# Altium schematic symbol library jlcpcb_2025_04_capacitors_extended_1206.schlib: 2503 symbols (part 11 of 14)
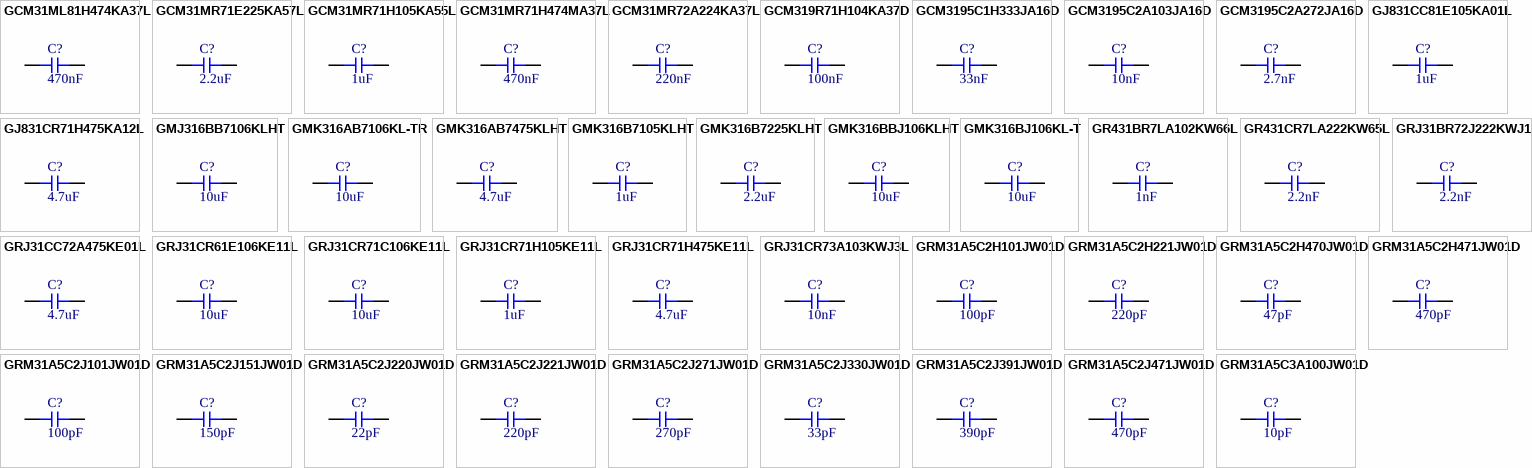
[diagram p72: symbols GCM31ML81H474KA37L to GRM31A5C3A100JW01D]

## GRM31A5C2H470JW01D
designator C?  Capacitance: 47pF  (hidden comment: *)
Capacitor, Ceramic (MLCC), 47pF, ±5%, 500V, C0G, ±5%, SMD 1206; Manufacturer: Murata Electronics; Manufacturer Part Number: GRM31A5C2H470JW01D; Package Size: 1206; JLCPCB Basic Part: No; JLCPCB Part Number: C162442; Supplier 1: LCSC; Category: Capacitors - MLCC; Supplier Part Number 1: C162442; Tolerance: ±5%; Voltage Rating: 500V; Temperature Coefficient: C0G; RoHS: Yes; ComponentLink1Description: Datasheet; ComponentLink1URL: https://wmsc.lcsc.com/wmsc/upload/file/pdf/v2/lcsc/1810201241_Murata-Electronics-GRM31A5C2H470JW01D_C162442.pdf; ComponentLink2Description: JLCPCB Part URL; ComponentLink2URL: https://jlcpcb.com/partdetail/C162442; ComponentLink3Description: LCSC Part URL; ComponentLink3URL: https://lcsc.com/product-detail/Multilayer-Ceramic-Capacitors-MLCC---SMD-SMT_Murata-Electronics-Murata-Electronics-GRM31A5C2H470JW01D_C162442.html
footprint CAP-1206 (1206 (3216M) Capacitor)
pins: 1, 2

## GRM31A5C2H471JW01D
designator C?  Capacitance: 470pF  (hidden comment: *)
Capacitor, Ceramic (MLCC), 470pF, ±5%, 500V, C0G, ±5%, SMD 1206; Manufacturer: Murata Electronics; Manufacturer Part Number: GRM31A5C2H471JW01D; Package Size: 1206; JLCPCB Basic Part: No; JLCPCB Part Number: C408150; Supplier 1: LCSC; Category: Capacitors - MLCC; Supplier Part Number 1: C408150; Tolerance: ±5%; Voltage Rating: 500V; Temperature Coefficient: C0G; RoHS: Yes; ComponentLink1Description: Datasheet; ComponentLink1URL: https://wmsc.lcsc.com/wmsc/upload/file/pdf/v2/lcsc/2304140030_Murata-Electronics-GRM31A5C2H471JW01D_C408150.pdf; ComponentLink2Description: JLCPCB Part URL; ComponentLink2URL: https://jlcpcb.com/partdetail/C408150; ComponentLink3Description: LCSC Part URL; ComponentLink3URL: https://lcsc.com/product-detail/Multilayer-Ceramic-Capacitors-MLCC---SMD-SMT_Murata-Electronics-Murata-Electronics-GRM31A5C2H471JW01D_C408150.html
footprint CAP-1206 (1206 (3216M) Capacitor)
pins: 1, 2

## GRM31A5C2J101JW01D
designator C?  Capacitance: 100pF  (hidden comment: *)
Capacitor, Ceramic (MLCC), 100pF, ±5%, 630V, C0G, ±5%, SMD 1206; Manufacturer: Murata Electronics; Manufacturer Part Number: GRM31A5C2J101JW01D; Package Size: 1206; JLCPCB Basic Part: No; JLCPCB Part Number: C162444; Supplier 1: LCSC; Category: Capacitors - MLCC; Supplier Part Number 1: C162444; Tolerance: ±5%; Voltage Rating: 630V; Temperature Coefficient: C0G; RoHS: Yes; ComponentLink1Description: Datasheet; ComponentLink1URL: https://wmsc.lcsc.com/wmsc/upload/file/pdf/v2/lcsc/1811110920_Murata-Electronics-GRM31A5C2J101JW01D_C162444.pdf; ComponentLink2Description: JLCPCB Part URL; ComponentLink2URL: https://jlcpcb.com/partdetail/C162444; ComponentLink3Description: LCSC Part URL; ComponentLink3URL: https://lcsc.com/product-detail/Multilayer-Ceramic-Capacitors-MLCC---SMD-SMT_Murata-Electronics-Murata-Electronics-GRM31A5C2J101JW01D_C162444.html
footprint CAP-1206 (1206 (3216M) Capacitor)
pins: 1, 2

## GRM31A5C2J151JW01D
designator C?  Capacitance: 150pF  (hidden comment: *)
Capacitor, Ceramic (MLCC), 150pF, ±5%, 630V, C0G, ±5%, SMD 1206; Manufacturer: Murata Electronics; Manufacturer Part Number: GRM31A5C2J151JW01D; Package Size: 1206; JLCPCB Basic Part: No; JLCPCB Part Number: C162445; Supplier 1: LCSC; Category: Capacitors - MLCC; Supplier Part Number 1: C162445; Tolerance: ±5%; Voltage Rating: 630V; Temperature Coefficient: C0G; RoHS: Yes; ComponentLink1Description: Datasheet; ComponentLink1URL: https://wmsc.lcsc.com/wmsc/upload/file/pdf/v2/lcsc/2308111643_Murata-Electronics-GRM31A5C2J151JW01D_C162445.pdf; ComponentLink2Description: JLCPCB Part URL; ComponentLink2URL: https://jlcpcb.com/partdetail/C162445; ComponentLink3Description: LCSC Part URL; ComponentLink3URL: https://lcsc.com/product-detail/Multilayer-Ceramic-Capacitors-MLCC---SMD-SMT_Murata-Electronics-Murata-Electronics-GRM31A5C2J151JW01D_C162445.html
footprint CAP-1206 (1206 (3216M) Capacitor)
pins: 1, 2

## GRM31A5C2J220JW01D
designator C?  Capacitance: 22pF  (hidden comment: *)
Capacitor, Ceramic (MLCC), 22pF, ±5%, 630V, C0G, ±5%, SMD 1206; Manufacturer: Murata Electronics; Manufacturer Part Number: GRM31A5C2J220JW01D; Package Size: 1206; JLCPCB Basic Part: No; JLCPCB Part Number: C162446; Supplier 1: LCSC; Category: Capacitors - MLCC; Supplier Part Number 1: C162446; Tolerance: ±5%; Voltage Rating: 630V; Temperature Coefficient: C0G; RoHS: Yes; ComponentLink1Description: Datasheet; ComponentLink1URL: https://wmsc.lcsc.com/wmsc/upload/file/pdf/v2/lcsc/2304140030_Murata-Electronics-GRM31A5C2J220JW01D_C162446.pdf; ComponentLink2Description: JLCPCB Part URL; ComponentLink2URL: https://jlcpcb.com/partdetail/C162446; ComponentLink3Description: LCSC Part URL; ComponentLink3URL: https://lcsc.com/product-detail/Multilayer-Ceramic-Capacitors-MLCC---SMD-SMT_Murata-Electronics-Murata-Electronics-GRM31A5C2J220JW01D_C162446.html
footprint CAP-1206 (1206 (3216M) Capacitor)
pins: 1, 2

## GRM31A5C2J221JW01D
designator C?  Capacitance: 220pF  (hidden comment: *)
Capacitor, Ceramic (MLCC), 220pF, ±5%, 630V, C0G, ±5%, SMD 1206; Manufacturer: Murata Electronics; Manufacturer Part Number: GRM31A5C2J221JW01D; Package Size: 1206; JLCPCB Basic Part: No; JLCPCB Part Number: C162447; Supplier 1: LCSC; Category: Capacitors - MLCC; Supplier Part Number 1: C162447; Tolerance: ±5%; Voltage Rating: 630V; Temperature Coefficient: C0G; RoHS: Yes; ComponentLink1Description: Datasheet; ComponentLink1URL: https://wmsc.lcsc.com/wmsc/upload/file/pdf/v2/lcsc/2304140030_Murata-Electronics-GRM31A5C2J221JW01D_C162447.pdf; ComponentLink2Description: JLCPCB Part URL; ComponentLink2URL: https://jlcpcb.com/partdetail/C162447; ComponentLink3Description: LCSC Part URL; ComponentLink3URL: https://lcsc.com/product-detail/Multilayer-Ceramic-Capacitors-MLCC---SMD-SMT_Murata-Electronics-Murata-Electronics-GRM31A5C2J221JW01D_C162447.html
footprint CAP-1206 (1206 (3216M) Capacitor)
pins: 1, 2

## GRM31A5C2J271JW01D
designator C?  Capacitance: 270pF  (hidden comment: *)
Capacitor, Ceramic (MLCC), 270pF, ±5%, 630V, C0G, ±5%, SMD 1206; Manufacturer: Murata Electronics; Manufacturer Part Number: GRM31A5C2J271JW01D; Package Size: 1206; JLCPCB Basic Part: No; JLCPCB Part Number: C711023; Supplier 1: LCSC; Category: Capacitors - MLCC; Supplier Part Number 1: C711023; Tolerance: ±5%; Voltage Rating: 630V; Temperature Coefficient: C0G; RoHS: Yes; ComponentLink1Description: Datasheet; ComponentLink1URL: https://wmsc.lcsc.com/wmsc/upload/file/pdf/v2/lcsc/2308111643_Murata-Electronics-GRM31A5C2J271JW01D_C711023.pdf; ComponentLink2Description: JLCPCB Part URL; ComponentLink2URL: https://jlcpcb.com/partdetail/C711023; ComponentLink3Description: LCSC Part URL; ComponentLink3URL: https://lcsc.com/product-detail/Multilayer-Ceramic-Capacitors-MLCC---SMD-SMT_Murata-Electronics-Murata-Electronics-GRM31A5C2J271JW01D_C711023.html
footprint CAP-1206 (1206 (3216M) Capacitor)
pins: 1, 2

## GRM31A5C2J330JW01D
designator C?  Capacitance: 33pF  (hidden comment: *)
Capacitor, Ceramic (MLCC), 33pF, ±5%, 630V, C0G, ±5%, SMD 1206; Manufacturer: Murata Electronics; Manufacturer Part Number: GRM31A5C2J330JW01D; Package Size: 1206; JLCPCB Basic Part: No; JLCPCB Part Number: C415521; Supplier 1: LCSC; Category: Capacitors - MLCC; Supplier Part Number 1: C415521; Tolerance: ±5%; Voltage Rating: 630V; Temperature Coefficient: C0G; RoHS: Yes; ComponentLink1Description: Datasheet; ComponentLink1URL: https://wmsc.lcsc.com/wmsc/upload/file/pdf/v2/lcsc/2304140030_Murata-Electronics-GRM31A5C2J330JW01D_C415521.pdf; ComponentLink2Description: JLCPCB Part URL; ComponentLink2URL: https://jlcpcb.com/partdetail/C415521; ComponentLink3Description: LCSC Part URL; ComponentLink3URL: https://lcsc.com/product-detail/Multilayer-Ceramic-Capacitors-MLCC---SMD-SMT_Murata-Electronics-Murata-Electronics-GRM31A5C2J330JW01D_C415521.html
footprint CAP-1206 (1206 (3216M) Capacitor)
pins: 1, 2

## GRM31A5C2J391JW01D
designator C?  Capacitance: 390pF  (hidden comment: *)
Capacitor, Ceramic (MLCC), 390pF, ±5%, 630V, null, ±5%, SMD 1206; Manufacturer: Murata Electronics; Manufacturer Part Number: GRM31A5C2J391JW01D; Package Size: 1206; JLCPCB Basic Part: No; JLCPCB Part Number: C2168016; Supplier 1: LCSC; Category: Capacitors - MLCC; Supplier Part Number 1: C2168016; Tolerance: ±5%; Voltage Rating: 630V; Temperature Coefficient: null; RoHS: Yes; ComponentLink1Description: Datasheet; ComponentLink1URL: https://wmsc.lcsc.com/wmsc/upload/file/pdf/v2/lcsc/2308111643_Murata-Electronics-GRM31A5C2J391JW01D_C2168016.pdf; ComponentLink2Description: JLCPCB Part URL; ComponentLink2URL: https://jlcpcb.com/partdetail/C2168016; ComponentLink3Description: LCSC Part URL; ComponentLink3URL: https://lcsc.com/product-detail/Multilayer-Ceramic-Capacitors-MLCC---SMD-SMT_Murata-Electronics-Murata-Electronics-GRM31A5C2J391JW01D_C2168016.html
footprint CAP-1206 (1206 (3216M) Capacitor)
pins: 1, 2

## GRM31A5C2J471JW01D
designator C?  Capacitance: 470pF  (hidden comment: *)
Capacitor, Ceramic (MLCC), 470pF, ±5%, 630V, C0G, ±5%, SMD 1206; Manufacturer: Murata Electronics; Manufacturer Part Number: GRM31A5C2J471JW01D; Package Size: 1206; JLCPCB Basic Part: No; JLCPCB Part Number: C162449; Supplier 1: LCSC; Category: Capacitors - MLCC; Supplier Part Number 1: C162449; Tolerance: ±5%; Voltage Rating: 630V; Temperature Coefficient: C0G; RoHS: Yes; ComponentLink1Description: Datasheet; ComponentLink1URL: https://wmsc.lcsc.com/wmsc/upload/file/pdf/v2/lcsc/2308111643_Murata-Electronics-GRM31A5C2J471JW01D_C162449.pdf; ComponentLink2Description: JLCPCB Part URL; ComponentLink2URL: https://jlcpcb.com/partdetail/C162449; ComponentLink3Description: LCSC Part URL; ComponentLink3URL: https://lcsc.com/product-detail/Multilayer-Ceramic-Capacitors-MLCC---SMD-SMT_Murata-Electronics-Murata-Electronics-GRM31A5C2J471JW01D_C162449.html
footprint CAP-1206 (1206 (3216M) Capacitor)
pins: 1, 2

## GRM31A5C3A100JW01D
designator C?  Capacitance: 10pF  (hidden comment: *)
Capacitor, Ceramic (MLCC), 10pF, ±5%, 1kV, C0G, ±5%, SMD 1206; Manufacturer: Murata Electronics; Manufacturer Part Number: GRM31A5C3A100JW01D; Package Size: 1206; JLCPCB Basic Part: No; JLCPCB Part Number: C162450; Supplier 1: LCSC; Category: Capacitors - MLCC; Supplier Part Number 1: C162450; Tolerance: ±5%; Voltage Rating: 1kV; Temperature Coefficient: C0G; RoHS: Yes; ComponentLink1Description: Datasheet; ComponentLink1URL: https://wmsc.lcsc.com/wmsc/upload/file/pdf/v2/lcsc/2304140030_Murata-Electronics-GRM31A5C3A100JW01D_C162450.pdf; ComponentLink2Description: JLCPCB Part URL; ComponentLink2URL: https://jlcpcb.com/partdetail/C162450; ComponentLink3Description: LCSC Part URL; ComponentLink3URL: https://lcsc.com/product-detail/Multilayer-Ceramic-Capacitors-MLCC---SMD-SMT_Murata-Electronics-Murata-Electronics-GRM31A5C3A100JW01D_C162450.html
footprint CAP-1206 (1206 (3216M) Capacitor)
pins: 1, 2

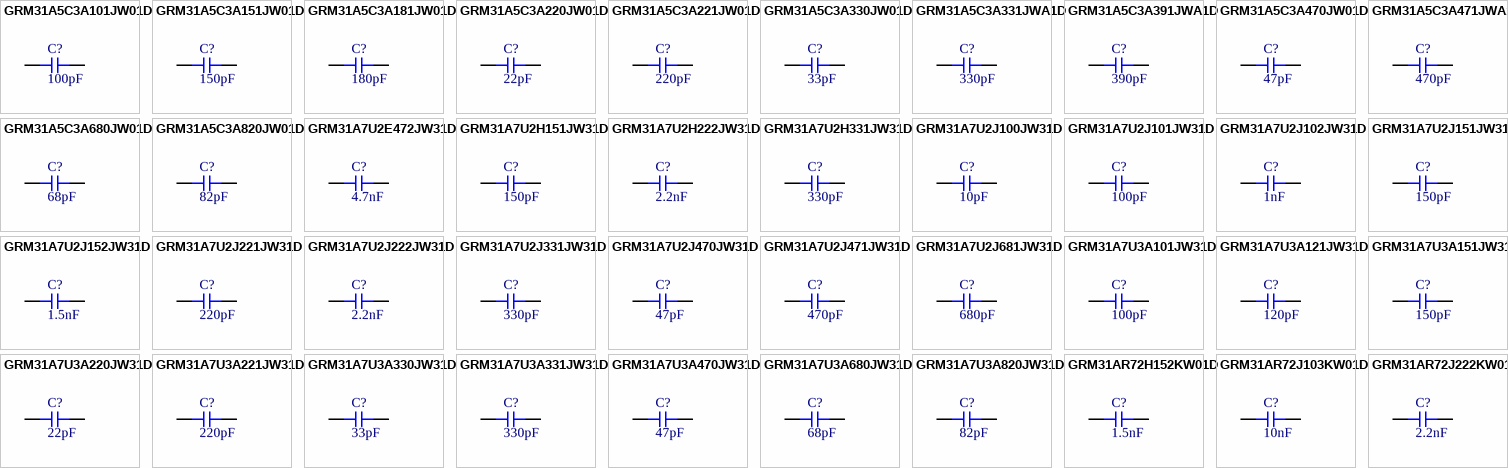
[diagram p46: symbols GRM31A5C3A101JW01D to GRM31AR72J222KW01D]

## GRM31A5C3A101JW01D
designator C?  Capacitance: 100pF  (hidden comment: *)
Capacitor, Ceramic (MLCC), 100pF, ±5%, 1kV, C0G, ±5%, SMD 1206; Manufacturer: Murata Electronics; Manufacturer Part Number: GRM31A5C3A101JW01D; Package Size: 1206; JLCPCB Basic Part: No; JLCPCB Part Number: C162451; Supplier 1: LCSC; Category: Capacitors - MLCC; Supplier Part Number 1: C162451; Tolerance: ±5%; Voltage Rating: 1kV; Temperature Coefficient: C0G; RoHS: Yes; ComponentLink1Description: Datasheet; ComponentLink1URL: https://wmsc.lcsc.com/wmsc/upload/file/pdf/v2/lcsc/1810201249_Murata-Electronics-GRM31A5C3A101JW01D_C162451.pdf; ComponentLink2Description: JLCPCB Part URL; ComponentLink2URL: https://jlcpcb.com/partdetail/C162451; ComponentLink3Description: LCSC Part URL; ComponentLink3URL: https://lcsc.com/product-detail/Multilayer-Ceramic-Capacitors-MLCC---SMD-SMT_Murata-Electronics-Murata-Electronics-GRM31A5C3A101JW01D_C162451.html
footprint CAP-1206 (1206 (3216M) Capacitor)
pins: 1, 2

## GRM31A5C3A151JW01D
designator C?  Capacitance: 150pF  (hidden comment: *)
Capacitor, Ceramic (MLCC), 150pF, ±5%, 1kV, C0G, ±5%, SMD 1206; Manufacturer: Murata Electronics; Manufacturer Part Number: GRM31A5C3A151JW01D; Package Size: 1206; JLCPCB Basic Part: No; JLCPCB Part Number: C162452; Supplier 1: LCSC; Category: Capacitors - MLCC; Supplier Part Number 1: C162452; Tolerance: ±5%; Voltage Rating: 1kV; Temperature Coefficient: C0G; RoHS: Yes; ComponentLink1Description: Datasheet; ComponentLink1URL: https://wmsc.lcsc.com/wmsc/upload/file/pdf/v2/lcsc/2308111643_Murata-Electronics-GRM31A5C3A151JW01D_C162452.pdf; ComponentLink2Description: JLCPCB Part URL; ComponentLink2URL: https://jlcpcb.com/partdetail/C162452; ComponentLink3Description: LCSC Part URL; ComponentLink3URL: https://lcsc.com/product-detail/Multilayer-Ceramic-Capacitors-MLCC---SMD-SMT_Murata-Electronics-Murata-Electronics-GRM31A5C3A151JW01D_C162452.html
footprint CAP-1206 (1206 (3216M) Capacitor)
pins: 1, 2

## GRM31A5C3A181JW01D
designator C?  Capacitance: 180pF  (hidden comment: *)
Capacitor, Ceramic (MLCC), 180pF, ±5%, 1kV, C0G, ±5%, SMD 1206; Manufacturer: Murata Electronics; Manufacturer Part Number: GRM31A5C3A181JW01D; Package Size: 1206; JLCPCB Basic Part: No; JLCPCB Part Number: C3832761; Supplier 1: LCSC; Category: Capacitors - MLCC; Supplier Part Number 1: C3832761; Tolerance: ±5%; Voltage Rating: 1kV; Temperature Coefficient: C0G; RoHS: Yes; ComponentLink1Description: Datasheet; ComponentLink1URL: https://wmsc.lcsc.com/wmsc/upload/file/pdf/v2/lcsc/2308111741_Murata-Electronics-GRM31A5C3A181JW01D_C3832761.pdf; ComponentLink2Description: JLCPCB Part URL; ComponentLink2URL: https://jlcpcb.com/partdetail/C3832761; ComponentLink3Description: LCSC Part URL; ComponentLink3URL: https://lcsc.com/product-detail/Multilayer-Ceramic-Capacitors-MLCC---SMD-SMT_Murata-Electronics-Murata-Electronics-GRM31A5C3A181JW01D_C3832761.html
footprint CAP-1206 (1206 (3216M) Capacitor)
pins: 1, 2

## GRM31A5C3A220JW01D
designator C?  Capacitance: 22pF  (hidden comment: *)
Capacitor, Ceramic (MLCC), 22pF, ±5%, 1kV, C0G, ±5%, SMD 1206; Manufacturer: Murata Electronics; Manufacturer Part Number: GRM31A5C3A220JW01D; Package Size: 1206; JLCPCB Basic Part: No; JLCPCB Part Number: C701198; Supplier 1: LCSC; Category: Capacitors - MLCC; Supplier Part Number 1: C701198; Tolerance: ±5%; Voltage Rating: 1kV; Temperature Coefficient: C0G; RoHS: Yes; ComponentLink1Description: Datasheet; ComponentLink1URL: https://wmsc.lcsc.com/wmsc/upload/file/pdf/v2/lcsc/2007151336_Murata-Electronics-GRM31A5C3A220JW01D_C701198.pdf; ComponentLink2Description: JLCPCB Part URL; ComponentLink2URL: https://jlcpcb.com/partdetail/C701198; ComponentLink3Description: LCSC Part URL; ComponentLink3URL: https://lcsc.com/product-detail/Multilayer-Ceramic-Capacitors-MLCC---SMD-SMT_Murata-Electronics-Murata-Electronics-GRM31A5C3A220JW01D_C701198.html
footprint CAP-1206 (1206 (3216M) Capacitor)
pins: 1, 2

## GRM31A5C3A221JW01D
designator C?  Capacitance: 220pF  (hidden comment: *)
Capacitor, Ceramic (MLCC), 220pF, ±5%, 1kV, C0G, ±5%, SMD 1206; Manufacturer: Murata Electronics; Manufacturer Part Number: GRM31A5C3A221JW01D; Package Size: 1206; JLCPCB Basic Part: No; JLCPCB Part Number: C361064; Supplier 1: LCSC; Category: Capacitors - MLCC; Supplier Part Number 1: C361064; Tolerance: ±5%; Voltage Rating: 1kV; Temperature Coefficient: C0G; RoHS: Yes; ComponentLink1Description: Datasheet; ComponentLink1URL: https://wmsc.lcsc.com/wmsc/upload/file/pdf/v2/lcsc/1912111437_Murata-Electronics-GRM31A5C3A221JW01D_C361064.pdf; ComponentLink2Description: JLCPCB Part URL; ComponentLink2URL: https://jlcpcb.com/partdetail/C361064; ComponentLink3Description: LCSC Part URL; ComponentLink3URL: https://lcsc.com/product-detail/Multilayer-Ceramic-Capacitors-MLCC---SMD-SMT_Murata-Electronics-Murata-Electronics-GRM31A5C3A221JW01D_C361064.html
footprint CAP-1206 (1206 (3216M) Capacitor)
pins: 1, 2

## GRM31A5C3A330JW01D
designator C?  Capacitance: 33pF  (hidden comment: *)
Capacitor, Ceramic (MLCC), 33pF, ±5%, 1kV, C0G, ±5%, SMD 1206; Manufacturer: Murata Electronics; Manufacturer Part Number: GRM31A5C3A330JW01D; Package Size: 1206; JLCPCB Basic Part: No; JLCPCB Part Number: C162453; Supplier 1: LCSC; Category: Capacitors - MLCC; Supplier Part Number 1: C162453; Tolerance: ±5%; Voltage Rating: 1kV; Temperature Coefficient: C0G; RoHS: Yes; ComponentLink1Description: Datasheet; ComponentLink1URL: https://wmsc.lcsc.com/wmsc/upload/file/pdf/v2/lcsc/1810201241_Murata-Electronics-GRM31A5C3A330JW01D_C162453.pdf; ComponentLink2Description: JLCPCB Part URL; ComponentLink2URL: https://jlcpcb.com/partdetail/C162453; ComponentLink3Description: LCSC Part URL; ComponentLink3URL: https://lcsc.com/product-detail/Multilayer-Ceramic-Capacitors-MLCC---SMD-SMT_Murata-Electronics-Murata-Electronics-GRM31A5C3A330JW01D_C162453.html
footprint CAP-1206 (1206 (3216M) Capacitor)
pins: 1, 2

## GRM31A5C3A331JWA1D
designator C?  Capacitance: 330pF  (hidden comment: *)
Capacitor, Ceramic (MLCC), 330pF, ±5%, 1kV, ±5%, SMD 1206; Manufacturer: Murata Electronics; Manufacturer Part Number: GRM31A5C3A331JWA1D; Package Size: 1206; JLCPCB Basic Part: No; JLCPCB Part Number: C701166; Supplier 1: LCSC; Category: Capacitors - MLCC; Supplier Part Number 1: C701166; Tolerance: ±5%; Voltage Rating: 1kV; RoHS: Yes; ComponentLink1Description: Datasheet; ComponentLink1URL: https://wmsc.lcsc.com/wmsc/upload/file/pdf/v2/lcsc/2201131100_Murata-Electronics-GRM31A5C3A331JWA1D_C701166.pdf; ComponentLink2Description: JLCPCB Part URL; ComponentLink2URL: https://jlcpcb.com/partdetail/C701166; ComponentLink3Description: LCSC Part URL; ComponentLink3URL: https://lcsc.com/product-detail/Multilayer-Ceramic-Capacitors-MLCC---SMD-SMT_Murata-Electronics-Murata-Electronics-GRM31A5C3A331JWA1D_C701166.html
footprint CAP-1206 (1206 (3216M) Capacitor)
pins: 1, 2

## GRM31A5C3A391JWA1D
designator C?  Capacitance: 390pF  (hidden comment: *)
Capacitor, Ceramic (MLCC), 390pF, ±5%, ±5%, SMD 1206; Manufacturer: Murata Electronics; Manufacturer Part Number: GRM31A5C3A391JWA1D; Package Size: 1206; JLCPCB Basic Part: No; JLCPCB Part Number: C907751; Supplier 1: LCSC; Category: Capacitors - MLCC; Supplier Part Number 1: C907751; Tolerance: ±5%; RoHS: Yes; ComponentLink1Description: Datasheet; ComponentLink1URL: https://wmsc.lcsc.com/wmsc/upload/file/pdf/v2/lcsc/2011151633_Murata-Electronics-GRM31A5C3A391JWA1D_C907751.pdf; ComponentLink2Description: JLCPCB Part URL; ComponentLink2URL: https://jlcpcb.com/partdetail/C907751; ComponentLink3Description: LCSC Part URL; ComponentLink3URL: https://lcsc.com/product-detail/Multilayer-Ceramic-Capacitors-MLCC---SMD-SMT_Murata-Electronics-Murata-Electronics-GRM31A5C3A391JWA1D_C907751.html
footprint CAP-1206 (1206 (3216M) Capacitor)
pins: 1, 2

## GRM31A5C3A470JW01D
designator C?  Capacitance: 47pF  (hidden comment: *)
Capacitor, Ceramic (MLCC), 47pF, ±5%, 1kV, C0G, ±5%, SMD 1206; Manufacturer: Murata Electronics; Manufacturer Part Number: GRM31A5C3A470JW01D; Package Size: 1206; JLCPCB Basic Part: No; JLCPCB Part Number: C162454; Supplier 1: LCSC; Category: Capacitors - MLCC; Supplier Part Number 1: C162454; Tolerance: ±5%; Voltage Rating: 1kV; Temperature Coefficient: C0G; RoHS: Yes; ComponentLink1Description: Datasheet; ComponentLink1URL: https://wmsc.lcsc.com/wmsc/upload/file/pdf/v2/lcsc/2308111643_Murata-Electronics-GRM31A5C3A470JW01D_C162454.pdf; ComponentLink2Description: JLCPCB Part URL; ComponentLink2URL: https://jlcpcb.com/partdetail/C162454; ComponentLink3Description: LCSC Part URL; ComponentLink3URL: https://lcsc.com/product-detail/Multilayer-Ceramic-Capacitors-MLCC---SMD-SMT_Murata-Electronics-Murata-Electronics-GRM31A5C3A470JW01D_C162454.html
footprint CAP-1206 (1206 (3216M) Capacitor)
pins: 1, 2

## GRM31A5C3A471JWA1D
designator C?  Capacitance: 470pF  (hidden comment: *)
Capacitor, Ceramic (MLCC), 470pF, ±5%, 1kV, null, ±5%, SMD 1206; Manufacturer: Murata Electronics; Manufacturer Part Number: GRM31A5C3A471JWA1D; Package Size: 1206; JLCPCB Basic Part: No; JLCPCB Part Number: C701190; Supplier 1: LCSC; Category: Capacitors - MLCC; Supplier Part Number 1: C701190; Tolerance: ±5%; Voltage Rating: 1kV; Temperature Coefficient: null; RoHS: Yes; ComponentLink1Description: Datasheet; ComponentLink1URL: https://wmsc.lcsc.com/wmsc/upload/file/pdf/v2/lcsc/2201131100_Murata-Electronics-GRM31A5C3A471JWA1D_C701190.pdf; ComponentLink2Description: JLCPCB Part URL; ComponentLink2URL: https://jlcpcb.com/partdetail/C701190; ComponentLink3Description: LCSC Part URL; ComponentLink3URL: https://lcsc.com/product-detail/Multilayer-Ceramic-Capacitors-MLCC---SMD-SMT_Murata-Electronics-Murata-Electronics-GRM31A5C3A471JWA1D_C701190.html
footprint CAP-1206 (1206 (3216M) Capacitor)
pins: 1, 2

## GRM31A5C3A680JW01D
designator C?  Capacitance: 68pF  (hidden comment: *)
Capacitor, Ceramic (MLCC), 68pF, ±5%, 1kV, null, ±5%, SMD 1206; Manufacturer: Murata Electronics; Manufacturer Part Number: GRM31A5C3A680JW01D; Package Size: 1206; JLCPCB Basic Part: No; JLCPCB Part Number: C440203; Supplier 1: LCSC; Category: Capacitors - MLCC; Supplier Part Number 1: C440203; Tolerance: ±5%; Voltage Rating: 1kV; Temperature Coefficient: null; RoHS: Yes; ComponentLink1Description: Datasheet; ComponentLink1URL: https://wmsc.lcsc.com/wmsc/upload/file/pdf/v2/lcsc/2308111643_Murata-Electronics-GRM31A5C3A680JW01D_C440203.pdf; ComponentLink2Description: JLCPCB Part URL; ComponentLink2URL: https://jlcpcb.com/partdetail/C440203; ComponentLink3Description: LCSC Part URL; ComponentLink3URL: https://lcsc.com/product-detail/Multilayer-Ceramic-Capacitors-MLCC---SMD-SMT_Murata-Electronics-Murata-Electronics-GRM31A5C3A680JW01D_C440203.html
footprint CAP-1206 (1206 (3216M) Capacitor)
pins: 1, 2

## GRM31A5C3A820JW01D
designator C?  Capacitance: 82pF  (hidden comment: *)
Capacitor, Ceramic (MLCC), 82pF, ±5%, 1kV, null, ±5%, SMD 1206; Manufacturer: Murata Electronics; Manufacturer Part Number: GRM31A5C3A820JW01D; Package Size: 1206; JLCPCB Basic Part: No; JLCPCB Part Number: C2170892; Supplier 1: LCSC; Category: Capacitors - MLCC; Supplier Part Number 1: C2170892; Tolerance: ±5%; Voltage Rating: 1kV; Temperature Coefficient: null; RoHS: Yes; ComponentLink1Description: Datasheet; ComponentLink1URL: https://wmsc.lcsc.com/wmsc/upload/file/pdf/v2/lcsc/2308111643_Murata-Electronics-GRM31A5C3A820JW01D_C2170892.pdf; ComponentLink2Description: JLCPCB Part URL; ComponentLink2URL: https://jlcpcb.com/partdetail/C2170892; ComponentLink3Description: LCSC Part URL; ComponentLink3URL: https://lcsc.com/product-detail/Multilayer-Ceramic-Capacitors-MLCC---SMD-SMT_Murata-Electronics-Murata-Electronics-GRM31A5C3A820JW01D_C2170892.html
footprint CAP-1206 (1206 (3216M) Capacitor)
pins: 1, 2

## GRM31A7U2E472JW31D
designator C?  Capacitance: 4.7nF  (hidden comment: *)
Capacitor, Ceramic (MLCC), 4.7nF, ±5%, 250V, U2J, ±5%, SMD 1206; Manufacturer: Murata Electronics; Manufacturer Part Number: GRM31A7U2E472JW31D; Package Size: 1206; JLCPCB Basic Part: No; JLCPCB Part Number: C692632; Supplier 1: LCSC; Category: Capacitors - MLCC; Supplier Part Number 1: C692632; Tolerance: ±5%; Voltage Rating: 250V; Temperature Coefficient: U2J; RoHS: Yes; ComponentLink1Description: Datasheet; ComponentLink1URL: https://wmsc.lcsc.com/wmsc/upload/file/pdf/v2/lcsc/2308111642_Murata-Electronics-GRM31A7U2E472JW31D_C692632.pdf; ComponentLink2Description: JLCPCB Part URL; ComponentLink2URL: https://jlcpcb.com/partdetail/C692632; ComponentLink3Description: LCSC Part URL; ComponentLink3URL: https://lcsc.com/product-detail/Multilayer-Ceramic-Capacitors-MLCC---SMD-SMT_Murata-Electronics-Murata-Electronics-GRM31A7U2E472JW31D_C692632.html
footprint CAP-1206 (1206 (3216M) Capacitor)
pins: 1, 2

## GRM31A7U2H151JW31D
designator C?  Capacitance: 150pF  (hidden comment: *)
Capacitor, Ceramic (MLCC), 150pF, ±5%, 500V, U2J, ±5%, SMD 1206; Manufacturer: Murata Electronics; Manufacturer Part Number: GRM31A7U2H151JW31D; Package Size: 1206; JLCPCB Basic Part: No; JLCPCB Part Number: C162455; Supplier 1: LCSC; Category: Capacitors - MLCC; Supplier Part Number 1: C162455; Tolerance: ±5%; Voltage Rating: 500V; Temperature Coefficient: U2J; RoHS: Yes; ComponentLink1Description: Datasheet; ComponentLink1URL: https://wmsc.lcsc.com/wmsc/upload/file/pdf/v2/lcsc/2304140030_Murata-Electronics-GRM31A7U2H151JW31D_C162455.pdf; ComponentLink2Description: JLCPCB Part URL; ComponentLink2URL: https://jlcpcb.com/partdetail/C162455; ComponentLink3Description: LCSC Part URL; ComponentLink3URL: https://lcsc.com/product-detail/Multilayer-Ceramic-Capacitors-MLCC---SMD-SMT_Murata-Electronics-Murata-Electronics-GRM31A7U2H151JW31D_C162455.html
footprint CAP-1206 (1206 (3216M) Capacitor)
pins: 1, 2

## GRM31A7U2H222JW31D
designator C?  Capacitance: 2.2nF  (hidden comment: *)
Capacitor, Ceramic (MLCC), 2.2nF, ±5%, 500V, U2J, ±5%, SMD 1206; Manufacturer: Murata Electronics; Manufacturer Part Number: GRM31A7U2H222JW31D; Package Size: 1206; JLCPCB Basic Part: No; JLCPCB Part Number: C162456; Supplier 1: LCSC; Category: Capacitors - MLCC; Supplier Part Number 1: C162456; Tolerance: ±5%; Voltage Rating: 500V; Temperature Coefficient: U2J; RoHS: Yes; ComponentLink1Description: Datasheet; ComponentLink1URL: https://wmsc.lcsc.com/wmsc/upload/file/pdf/v2/lcsc/2308111642_Murata-Electronics-GRM31A7U2H222JW31D_C162456.pdf; ComponentLink2Description: JLCPCB Part URL; ComponentLink2URL: https://jlcpcb.com/partdetail/C162456; ComponentLink3Description: LCSC Part URL; ComponentLink3URL: https://lcsc.com/product-detail/Multilayer-Ceramic-Capacitors-MLCC---SMD-SMT_Murata-Electronics-Murata-Electronics-GRM31A7U2H222JW31D_C162456.html
footprint CAP-1206 (1206 (3216M) Capacitor)
pins: 1, 2

## GRM31A7U2H331JW31D
designator C?  Capacitance: 330pF  (hidden comment: *)
Capacitor, Ceramic (MLCC), 330pF, ±5%, 500V, U2J, ±5%, SMD 1206; Manufacturer: Murata Electronics; Manufacturer Part Number: GRM31A7U2H331JW31D; Package Size: 1206; JLCPCB Basic Part: No; JLCPCB Part Number: C162457; Supplier 1: LCSC; Category: Capacitors - MLCC; Supplier Part Number 1: C162457; Tolerance: ±5%; Voltage Rating: 500V; Temperature Coefficient: U2J; RoHS: Yes; ComponentLink1Description: Datasheet; ComponentLink1URL: https://wmsc.lcsc.com/wmsc/upload/file/pdf/v2/lcsc/2304140030_Murata-Electronics-GRM31A7U2H331JW31D_C162457.pdf; ComponentLink2Description: JLCPCB Part URL; ComponentLink2URL: https://jlcpcb.com/partdetail/C162457; ComponentLink3Description: LCSC Part URL; ComponentLink3URL: https://lcsc.com/product-detail/Multilayer-Ceramic-Capacitors-MLCC---SMD-SMT_Murata-Electronics-Murata-Electronics-GRM31A7U2H331JW31D_C162457.html
footprint CAP-1206 (1206 (3216M) Capacitor)
pins: 1, 2

## GRM31A7U2J100JW31D
designator C?  Capacitance: 10pF  (hidden comment: *)
Capacitor, Ceramic (MLCC), 10pF, ±5%, 630V, U2J, ±5%, SMD 1206; Manufacturer: Murata Electronics; Manufacturer Part Number: GRM31A7U2J100JW31D; Package Size: 1206; JLCPCB Basic Part: No; JLCPCB Part Number: C703130; Supplier 1: LCSC; Category: Capacitors - MLCC; Supplier Part Number 1: C703130; Tolerance: ±5%; Voltage Rating: 630V; Temperature Coefficient: U2J; RoHS: Yes; ComponentLink1Description: Datasheet; ComponentLink1URL: https://wmsc.lcsc.com/wmsc/upload/file/pdf/v2/lcsc/2304140030_Murata-Electronics-GRM31A7U2J100JW31D_C703130.pdf; ComponentLink2Description: JLCPCB Part URL; ComponentLink2URL: https://jlcpcb.com/partdetail/C703130; ComponentLink3Description: LCSC Part URL; ComponentLink3URL: https://lcsc.com/product-detail/Multilayer-Ceramic-Capacitors-MLCC---SMD-SMT_Murata-Electronics-Murata-Electronics-GRM31A7U2J100JW31D_C703130.html
footprint CAP-1206 (1206 (3216M) Capacitor)
pins: 1, 2

## GRM31A7U2J101JW31D
designator C?  Capacitance: 100pF  (hidden comment: *)
Capacitor, Ceramic (MLCC), 100pF, ±5%, 630V, U2J, ±5%, SMD 1206; Manufacturer: Murata Electronics; Manufacturer Part Number: GRM31A7U2J101JW31D; Package Size: 1206; JLCPCB Basic Part: No; JLCPCB Part Number: C97933; Supplier 1: LCSC; Category: Capacitors - MLCC; Supplier Part Number 1: C97933; Tolerance: ±5%; Voltage Rating: 630V; Temperature Coefficient: U2J; RoHS: Yes; ComponentLink1Description: Datasheet; ComponentLink1URL: https://wmsc.lcsc.com/wmsc/upload/file/pdf/v2/lcsc/1810201312_Murata-Electronics-GRM31A7U2J101JW31D_C97933.pdf; ComponentLink2Description: JLCPCB Part URL; ComponentLink2URL: https://jlcpcb.com/partdetail/C97933; ComponentLink3Description: LCSC Part URL; ComponentLink3URL: https://lcsc.com/product-detail/Multilayer-Ceramic-Capacitors-MLCC---SMD-SMT_Murata-Electronics-Murata-Electronics-GRM31A7U2J101JW31D_C97933.html
footprint CAP-1206 (1206 (3216M) Capacitor)
pins: 1, 2

## GRM31A7U2J102JW31D
designator C?  Capacitance: 1nF  (hidden comment: *)
Capacitor, Ceramic (MLCC), 1nF, ±5%, 630V, U2J, ±5%, SMD 1206; Manufacturer: Murata Electronics; Manufacturer Part Number: GRM31A7U2J102JW31D; Package Size: 1206; JLCPCB Basic Part: No; JLCPCB Part Number: C97934; Supplier 1: LCSC; Category: Capacitors - MLCC; Supplier Part Number 1: C97934; Tolerance: ±5%; Voltage Rating: 630V; Temperature Coefficient: U2J; RoHS: Yes; ComponentLink1Description: Datasheet; ComponentLink1URL: https://wmsc.lcsc.com/wmsc/upload/file/pdf/v2/lcsc/1810201314_Murata-Electronics-GRM31A7U2J102JW31D_C97934.pdf; ComponentLink2Description: JLCPCB Part URL; ComponentLink2URL: https://jlcpcb.com/partdetail/C97934; ComponentLink3Description: LCSC Part URL; ComponentLink3URL: https://lcsc.com/product-detail/Multilayer-Ceramic-Capacitors-MLCC---SMD-SMT_Murata-Electronics-Murata-Electronics-GRM31A7U2J102JW31D_C97934.html
footprint CAP-1206 (1206 (3216M) Capacitor)
pins: 1, 2

## GRM31A7U2J151JW31D
designator C?  Capacitance: 150pF  (hidden comment: *)
Capacitor, Ceramic (MLCC), 150pF, ±5%, 630V, U2J, ±5%, SMD 1206; Manufacturer: Murata Electronics; Manufacturer Part Number: GRM31A7U2J151JW31D; Package Size: 1206; JLCPCB Basic Part: No; JLCPCB Part Number: C162458; Supplier 1: LCSC; Category: Capacitors - MLCC; Supplier Part Number 1: C162458; Tolerance: ±5%; Voltage Rating: 630V; Temperature Coefficient: U2J; RoHS: Yes; ComponentLink1Description: Datasheet; ComponentLink1URL: https://wmsc.lcsc.com/wmsc/upload/file/pdf/v2/lcsc/2304140030_Murata-Electronics-GRM31A7U2J151JW31D_C162458.pdf; ComponentLink2Description: JLCPCB Part URL; ComponentLink2URL: https://jlcpcb.com/partdetail/C162458; ComponentLink3Description: LCSC Part URL; ComponentLink3URL: https://lcsc.com/product-detail/Multilayer-Ceramic-Capacitors-MLCC---SMD-SMT_Murata-Electronics-Murata-Electronics-GRM31A7U2J151JW31D_C162458.html
footprint CAP-1206 (1206 (3216M) Capacitor)
pins: 1, 2

## GRM31A7U2J152JW31D
designator C?  Capacitance: 1.5nF  (hidden comment: *)
Capacitor, Ceramic (MLCC), 1.5nF, ±5%, 630V, U2J, ±5%, SMD 1206; Manufacturer: Murata Electronics; Manufacturer Part Number: GRM31A7U2J152JW31D; Package Size: 1206; JLCPCB Basic Part: No; JLCPCB Part Number: C162459; Supplier 1: LCSC; Category: Capacitors - MLCC; Supplier Part Number 1: C162459; Tolerance: ±5%; Voltage Rating: 630V; Temperature Coefficient: U2J; RoHS: Yes; ComponentLink1Description: Datasheet; ComponentLink1URL: https://wmsc.lcsc.com/wmsc/upload/file/pdf/v2/lcsc/2304140030_Murata-Electronics-GRM31A7U2J152JW31D_C162459.pdf; ComponentLink2Description: JLCPCB Part URL; ComponentLink2URL: https://jlcpcb.com/partdetail/C162459; ComponentLink3Description: LCSC Part URL; ComponentLink3URL: https://lcsc.com/product-detail/Multilayer-Ceramic-Capacitors-MLCC---SMD-SMT_Murata-Electronics-Murata-Electronics-GRM31A7U2J152JW31D_C162459.html
footprint CAP-1206 (1206 (3216M) Capacitor)
pins: 1, 2

## GRM31A7U2J221JW31D
designator C?  Capacitance: 220pF  (hidden comment: *)
Capacitor, Ceramic (MLCC), 220pF, ±5%, 630V, U2J, ±5%, SMD 1206; Manufacturer: Murata Electronics; Manufacturer Part Number: GRM31A7U2J221JW31D; Package Size: 1206; JLCPCB Basic Part: No; JLCPCB Part Number: C162460; Supplier 1: LCSC; Category: Capacitors - MLCC; Supplier Part Number 1: C162460; Tolerance: ±5%; Voltage Rating: 630V; Temperature Coefficient: U2J; RoHS: Yes; ComponentLink1Description: Datasheet; ComponentLink1URL: https://wmsc.lcsc.com/wmsc/upload/file/pdf/v2/lcsc/2304140030_Murata-Electronics-GRM31A7U2J221JW31D_C162460.pdf; ComponentLink2Description: JLCPCB Part URL; ComponentLink2URL: https://jlcpcb.com/partdetail/C162460; ComponentLink3Description: LCSC Part URL; ComponentLink3URL: https://lcsc.com/product-detail/Multilayer-Ceramic-Capacitors-MLCC---SMD-SMT_Murata-Electronics-Murata-Electronics-GRM31A7U2J221JW31D_C162460.html
footprint CAP-1206 (1206 (3216M) Capacitor)
pins: 1, 2

## GRM31A7U2J222JW31D
designator C?  Capacitance: 2.2nF  (hidden comment: *)
Capacitor, Ceramic (MLCC), 2.2nF, ±5%, 630V, U2J, ±5%, SMD 1206; Manufacturer: Murata Electronics; Manufacturer Part Number: GRM31A7U2J222JW31D; Package Size: 1206; JLCPCB Basic Part: No; JLCPCB Part Number: C162461; Supplier 1: LCSC; Category: Capacitors - MLCC; Supplier Part Number 1: C162461; Tolerance: ±5%; Voltage Rating: 630V; Temperature Coefficient: U2J; RoHS: Yes; ComponentLink1Description: Datasheet; ComponentLink1URL: https://wmsc.lcsc.com/wmsc/upload/file/pdf/v2/lcsc/2304140030_Murata-Electronics-GRM31A7U2J222JW31D_C162461.pdf; ComponentLink2Description: JLCPCB Part URL; ComponentLink2URL: https://jlcpcb.com/partdetail/C162461; ComponentLink3Description: LCSC Part URL; ComponentLink3URL: https://lcsc.com/product-detail/Multilayer-Ceramic-Capacitors-MLCC---SMD-SMT_Murata-Electronics-Murata-Electronics-GRM31A7U2J222JW31D_C162461.html
footprint CAP-1206 (1206 (3216M) Capacitor)
pins: 1, 2

## GRM31A7U2J331JW31D
designator C?  Capacitance: 330pF  (hidden comment: *)
Capacitor, Ceramic (MLCC), 330pF, ±5%, 630V, U2J, ±5%, SMD 1206; Manufacturer: Murata Electronics; Manufacturer Part Number: GRM31A7U2J331JW31D; Package Size: 1206; JLCPCB Basic Part: No; JLCPCB Part Number: C162462; Supplier 1: LCSC; Category: Capacitors - MLCC; Supplier Part Number 1: C162462; Tolerance: ±5%; Voltage Rating: 630V; Temperature Coefficient: U2J; RoHS: Yes; ComponentLink1Description: Datasheet; ComponentLink1URL: https://wmsc.lcsc.com/wmsc/upload/file/pdf/v2/lcsc/1810201241_Murata-Electronics-GRM31A7U2J331JW31D_C162462.pdf; ComponentLink2Description: JLCPCB Part URL; ComponentLink2URL: https://jlcpcb.com/partdetail/C162462; ComponentLink3Description: LCSC Part URL; ComponentLink3URL: https://lcsc.com/product-detail/Multilayer-Ceramic-Capacitors-MLCC---SMD-SMT_Murata-Electronics-Murata-Electronics-GRM31A7U2J331JW31D_C162462.html
footprint CAP-1206 (1206 (3216M) Capacitor)
pins: 1, 2

## GRM31A7U2J470JW31D
designator C?  Capacitance: 47pF  (hidden comment: *)
Capacitor, Ceramic (MLCC), 47pF, ±5%, 630V, U2J, ±5%, SMD 1206; Manufacturer: Murata Electronics; Manufacturer Part Number: GRM31A7U2J470JW31D; Package Size: 1206; JLCPCB Basic Part: No; JLCPCB Part Number: C162463; Supplier 1: LCSC; Category: Capacitors - MLCC; Supplier Part Number 1: C162463; Tolerance: ±5%; Voltage Rating: 630V; Temperature Coefficient: U2J; RoHS: Yes; ComponentLink1Description: Datasheet; ComponentLink1URL: https://wmsc.lcsc.com/wmsc/upload/file/pdf/v2/lcsc/1810201251_Murata-Electronics-GRM31A7U2J470JW31D_C162463.pdf; ComponentLink2Description: JLCPCB Part URL; ComponentLink2URL: https://jlcpcb.com/partdetail/C162463; ComponentLink3Description: LCSC Part URL; ComponentLink3URL: https://lcsc.com/product-detail/Multilayer-Ceramic-Capacitors-MLCC---SMD-SMT_Murata-Electronics-Murata-Electronics-GRM31A7U2J470JW31D_C162463.html
footprint CAP-1206 (1206 (3216M) Capacitor)
pins: 1, 2

## GRM31A7U2J471JW31D
designator C?  Capacitance: 470pF  (hidden comment: *)
Capacitor, Ceramic (MLCC), 470pF, ±5%, 630V, U2J, ±5%, SMD 1206; Manufacturer: Murata Electronics; Manufacturer Part Number: GRM31A7U2J471JW31D; Package Size: 1206; JLCPCB Basic Part: No; JLCPCB Part Number: C162464; Supplier 1: LCSC; Category: Capacitors - MLCC; Supplier Part Number 1: C162464; Tolerance: ±5%; Voltage Rating: 630V; Temperature Coefficient: U2J; RoHS: Yes; ComponentLink1Description: Datasheet; ComponentLink1URL: https://wmsc.lcsc.com/wmsc/upload/file/pdf/v2/lcsc/2304140030_Murata-Electronics-GRM31A7U2J471JW31D_C162464.pdf; ComponentLink2Description: JLCPCB Part URL; ComponentLink2URL: https://jlcpcb.com/partdetail/C162464; ComponentLink3Description: LCSC Part URL; ComponentLink3URL: https://lcsc.com/product-detail/Multilayer-Ceramic-Capacitors-MLCC---SMD-SMT_Murata-Electronics-Murata-Electronics-GRM31A7U2J471JW31D_C162464.html
footprint CAP-1206 (1206 (3216M) Capacitor)
pins: 1, 2

## GRM31A7U2J681JW31D
designator C?  Capacitance: 680pF  (hidden comment: *)
Capacitor, Ceramic (MLCC), 680pF, ±5%, 630V, U2J, ±5%, SMD 1206; Manufacturer: Murata Electronics; Manufacturer Part Number: GRM31A7U2J681JW31D; Package Size: 1206; JLCPCB Basic Part: No; JLCPCB Part Number: C162466; Supplier 1: LCSC; Category: Capacitors - MLCC; Supplier Part Number 1: C162466; Tolerance: ±5%; Voltage Rating: 630V; Temperature Coefficient: U2J; RoHS: Yes; ComponentLink1Description: Datasheet; ComponentLink1URL: https://wmsc.lcsc.com/wmsc/upload/file/pdf/v2/lcsc/2304140030_Murata-Electronics-GRM31A7U2J681JW31D_C162466.pdf; ComponentLink2Description: JLCPCB Part URL; ComponentLink2URL: https://jlcpcb.com/partdetail/C162466; ComponentLink3Description: LCSC Part URL; ComponentLink3URL: https://lcsc.com/product-detail/Multilayer-Ceramic-Capacitors-MLCC---SMD-SMT_Murata-Electronics-Murata-Electronics-GRM31A7U2J681JW31D_C162466.html
footprint CAP-1206 (1206 (3216M) Capacitor)
pins: 1, 2

## GRM31A7U3A101JW31D
designator C?  Capacitance: 100pF  (hidden comment: *)
Capacitor, Ceramic (MLCC), 100pF, ±5%, 1kV, U2J, ±5%, SMD 1206; Manufacturer: Murata Electronics; Manufacturer Part Number: GRM31A7U3A101JW31D; Package Size: 1206; JLCPCB Basic Part: No; JLCPCB Part Number: C97935; Supplier 1: LCSC; Category: Capacitors - MLCC; Supplier Part Number 1: C97935; Tolerance: ±5%; Voltage Rating: 1kV; Temperature Coefficient: U2J; RoHS: Yes; ComponentLink1Description: Datasheet; ComponentLink1URL: https://wmsc.lcsc.com/wmsc/upload/file/pdf/v2/lcsc/1811081610_Murata-Electronics-GRM31A7U3A101JW31D_C97935.pdf; ComponentLink2Description: JLCPCB Part URL; ComponentLink2URL: https://jlcpcb.com/partdetail/C97935; ComponentLink3Description: LCSC Part URL; ComponentLink3URL: https://lcsc.com/product-detail/Multilayer-Ceramic-Capacitors-MLCC---SMD-SMT_Murata-Electronics-Murata-Electronics-GRM31A7U3A101JW31D_C97935.html
footprint CAP-1206 (1206 (3216M) Capacitor)
pins: 1, 2

## GRM31A7U3A121JW31D
designator C?  Capacitance: 120pF  (hidden comment: *)
Capacitor, Ceramic (MLCC), 120pF, ±5%, 1kV, U2J, ±5%, SMD 1206; Manufacturer: Murata Electronics; Manufacturer Part Number: GRM31A7U3A121JW31D; Package Size: 1206; JLCPCB Basic Part: No; JLCPCB Part Number: C437560; Supplier 1: LCSC; Category: Capacitors - MLCC; Supplier Part Number 1: C437560; Tolerance: ±5%; Voltage Rating: 1kV; Temperature Coefficient: U2J; RoHS: Yes; ComponentLink1Description: Datasheet; ComponentLink1URL: https://wmsc.lcsc.com/wmsc/upload/file/pdf/v2/lcsc/2304140030_Murata-Electronics-GRM31A7U3A121JW31D_C437560.pdf; ComponentLink2Description: JLCPCB Part URL; ComponentLink2URL: https://jlcpcb.com/partdetail/C437560; ComponentLink3Description: LCSC Part URL; ComponentLink3URL: https://lcsc.com/product-detail/Multilayer-Ceramic-Capacitors-MLCC---SMD-SMT_Murata-Electronics-Murata-Electronics-GRM31A7U3A121JW31D_C437560.html
footprint CAP-1206 (1206 (3216M) Capacitor)
pins: 1, 2

## GRM31A7U3A151JW31D
designator C?  Capacitance: 150pF  (hidden comment: *)
Capacitor, Ceramic (MLCC), 150pF, ±5%, 1kV, U2J, ±5%, SMD 1206; Manufacturer: Murata Electronics; Manufacturer Part Number: GRM31A7U3A151JW31D; Package Size: 1206; JLCPCB Basic Part: No; JLCPCB Part Number: C162467; Supplier 1: LCSC; Category: Capacitors - MLCC; Supplier Part Number 1: C162467; Tolerance: ±5%; Voltage Rating: 1kV; Temperature Coefficient: U2J; RoHS: Yes; ComponentLink1Description: Datasheet; ComponentLink1URL: https://wmsc.lcsc.com/wmsc/upload/file/pdf/v2/lcsc/2304140030_Murata-Electronics-GRM31A7U3A151JW31D_C162467.pdf; ComponentLink2Description: JLCPCB Part URL; ComponentLink2URL: https://jlcpcb.com/partdetail/C162467; ComponentLink3Description: LCSC Part URL; ComponentLink3URL: https://lcsc.com/product-detail/Multilayer-Ceramic-Capacitors-MLCC---SMD-SMT_Murata-Electronics-Murata-Electronics-GRM31A7U3A151JW31D_C162467.html
footprint CAP-1206 (1206 (3216M) Capacitor)
pins: 1, 2

## GRM31A7U3A220JW31D
designator C?  Capacitance: 22pF  (hidden comment: *)
Capacitor, Ceramic (MLCC), 22pF, ±5%, 1kV, U2J, ±5%, SMD 1206; Manufacturer: Murata Electronics; Manufacturer Part Number: GRM31A7U3A220JW31D; Package Size: 1206; JLCPCB Basic Part: No; JLCPCB Part Number: C162468; Supplier 1: LCSC; Category: Capacitors - MLCC; Supplier Part Number 1: C162468; Tolerance: ±5%; Voltage Rating: 1kV; Temperature Coefficient: U2J; RoHS: Yes; ComponentLink1Description: Datasheet; ComponentLink1URL: https://wmsc.lcsc.com/wmsc/upload/file/pdf/v2/lcsc/2304140030_Murata-Electronics-GRM31A7U3A220JW31D_C162468.pdf; ComponentLink2Description: JLCPCB Part URL; ComponentLink2URL: https://jlcpcb.com/partdetail/C162468; ComponentLink3Description: LCSC Part URL; ComponentLink3URL: https://lcsc.com/product-detail/Multilayer-Ceramic-Capacitors-MLCC---SMD-SMT_Murata-Electronics-Murata-Electronics-GRM31A7U3A220JW31D_C162468.html
footprint CAP-1206 (1206 (3216M) Capacitor)
pins: 1, 2

## GRM31A7U3A221JW31D
designator C?  Capacitance: 220pF  (hidden comment: *)
Capacitor, Ceramic (MLCC), 220pF, ±5%, 1kV, ±5%, SMD 1206; Manufacturer: Murata Electronics; Manufacturer Part Number: GRM31A7U3A221JW31D; Package Size: 1206; JLCPCB Basic Part: No; JLCPCB Part Number: C162469; Supplier 1: LCSC; Category: Capacitors - MLCC; Supplier Part Number 1: C162469; Tolerance: ±5%; Voltage Rating: 1kV; RoHS: Yes; ComponentLink1Description: Datasheet; ComponentLink1URL: https://wmsc.lcsc.com/wmsc/upload/file/pdf/v2/lcsc/2010301004_Murata-Electronics-GRM31A7U3A221JW31D_C162469.pdf; ComponentLink2Description: JLCPCB Part URL; ComponentLink2URL: https://jlcpcb.com/partdetail/C162469; ComponentLink3Description: LCSC Part URL; ComponentLink3URL: https://lcsc.com/product-detail/Multilayer-Ceramic-Capacitors-MLCC---SMD-SMT_Murata-Electronics-Murata-Electronics-GRM31A7U3A221JW31D_C162469.html
footprint CAP-1206 (1206 (3216M) Capacitor)
pins: 1, 2
